# Altium footprint library my Library.PcbLib: 1247 footprints (part 26 of 78)
Each footprint in its own frame and in the unit in brackets; x right, y up, seen from the top. Pads: shape width x height; smd on the part's side, far side on the other; paste and mask are expansions set on the pad; w line width, h text height; cw(c..) or ccw(c..) is an arc to the next point about the centre after c.
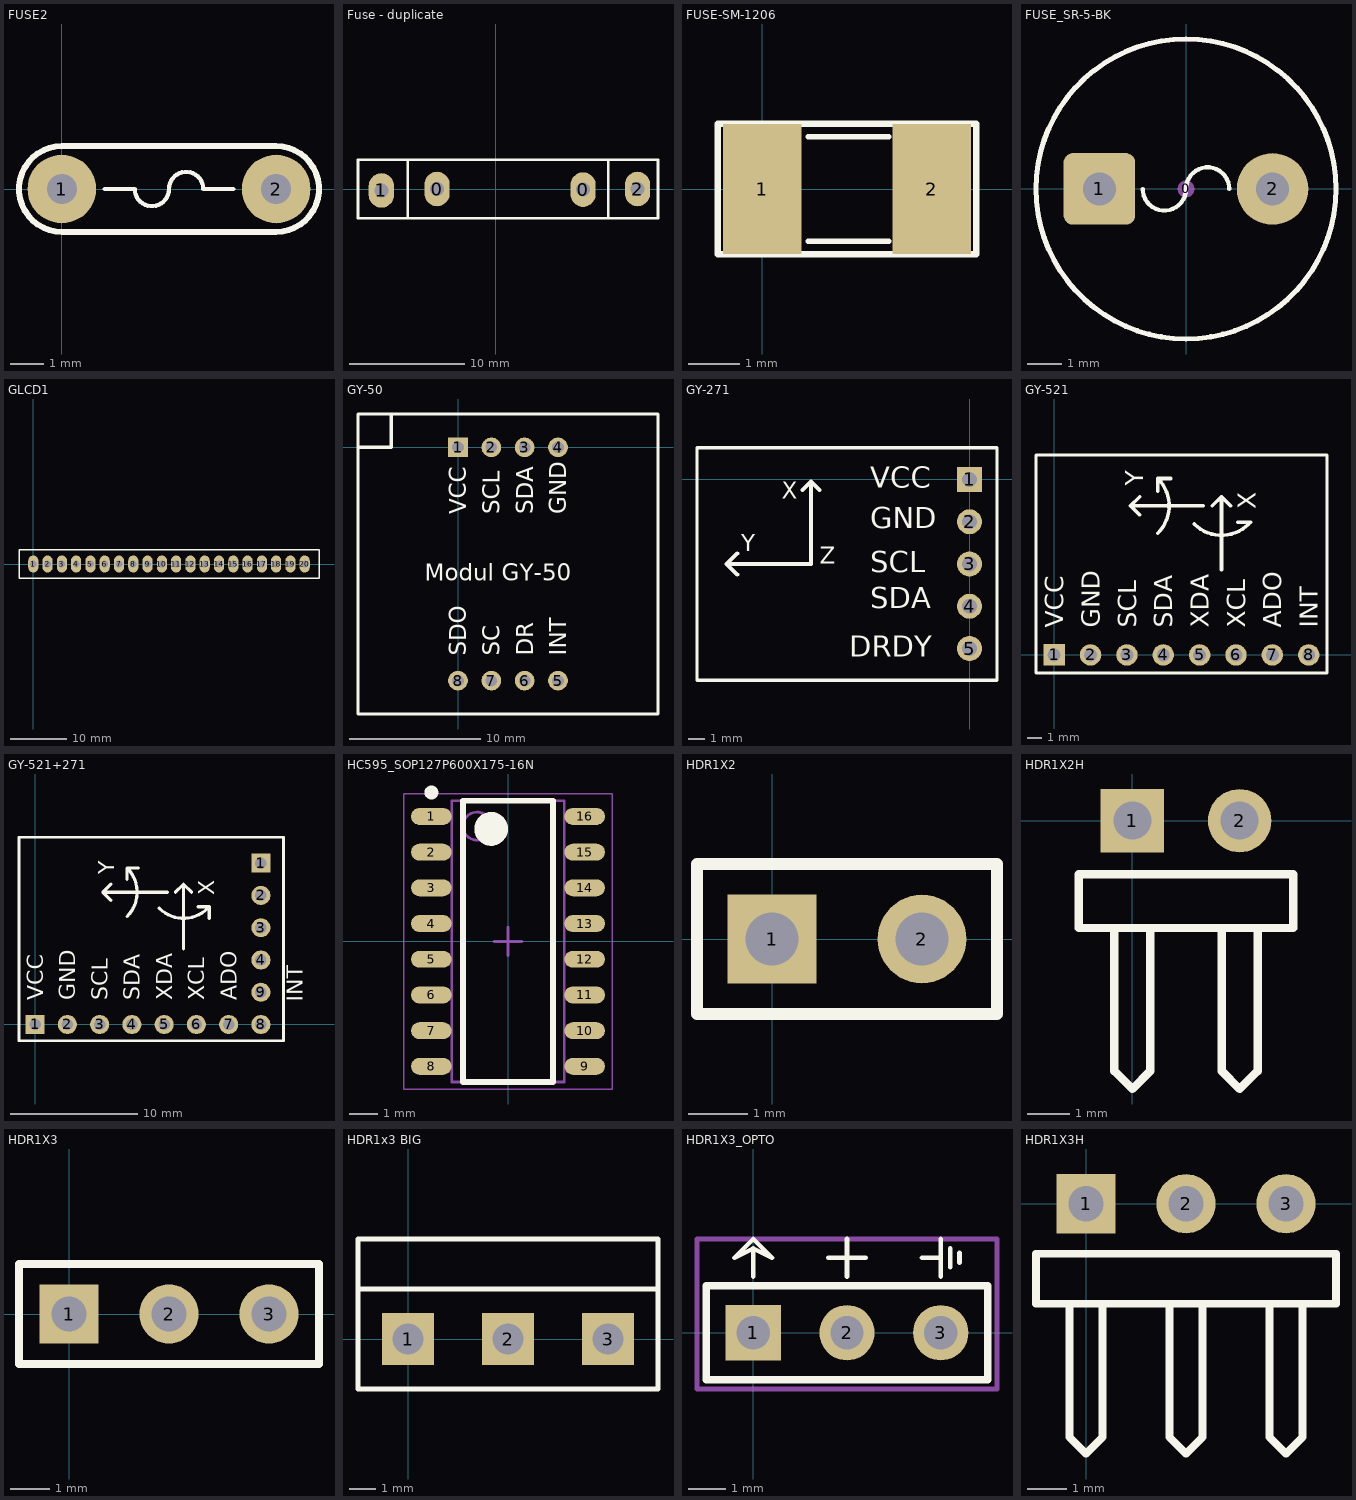
[diagram p25: the footprints below, top view; thin cyan lines are the x and y axes]

## FUSE2 [mil] "Fuse"
pads (2):
  round 80 hole 35: 1(0,0) 2(250,0)
Top Overlay:
  lines w5: 50,0 85,0 ccw(c105,0) 125,0 cw(c145,0) 165,0 200,0
  lines w7: 0,-50 cw(c0,0) 0,50 250,50 cw(c250,0) 250,-50 0,-50

## Fuse - duplicate [mm]
pads (4):
  oval 2.2x3 hole 1.2: 0(-5.08,0) 0(7.595,-0.051) 1(-9.906,-0.127) 2(12.319,0)
Top Overlay:
  lines w0.254: -7.62,-2.54 -7.62,2.54 ; 9.779,-2.54 9.779,2.54 ; -11.938,-2.54 14.097,-2.54 14.097,2.54 -11.938,2.54 -11.938,-2.54

## FUSE-SM-1206 [mil]
pads (2):
  rect 60x100 smd: 1(0,0) 2(130,0)
Top Overlay:
  lines w4: 35,-40 97,-40 ; 35,40 97,40
  lines w5: -34,-50 164,-50 164,50 -34,50 -34,-50
3D body "User Library-Fuse1210.STEP": height 26.57, standoff 0, extent 6.72,-50.68 133.29,50.69

## FUSE_SR-5-BK [mm]
height 9.3
pads (3):
  round 0.5 on Mech15: 0(0,0)
  rrect25% 2.1x2.1 hole 0.965: 1(-2.54,0)
  round 2.1 hole 0.965: 2(2.54,0)
Top Overlay:
  circle w0.152: c0,0 r4.4
  lines w0.127: -1.27,0 ccw(c-0.635,0) 0,0 cw(c0.635,0) 1.27,0
Mechanical 13:
  circle w0.127: c0,-0.003 r4.4
3D body "Fuse_SR-5-BK.STEP": height 8.29, standoff -2.55, extent -4.35,-4.321 4.35,4.315

## GLCD1 [mm]
pads (20):
  oval 1.8x3 hole 1.2: 1(0,0) 2(2.54,0) 3(5.08,0) 4(7.62,0) 5(10.16,0) 6(12.7,0) 7(15.24,0) 8(17.78,0) 9(20.32,0) 10(22.86,0) 11(25.4,0) 12(27.94,0) 13(30.48,0) 14(33.02,0) 15(35.56,0) 16(38.1,0) 17(40.64,0) 18(43.18,0) 19(45.72,0) 20(48.26,0)
Top Overlay:
  lines w0.254: -2.54,-2.54 50.8,-2.54 50.8,2.54 -2.54,2.54 -2.54,-2.54

## GY-50 [mm] "Connector; Header; 8 Position"
height 1.14
pads (8):
  rect 1.5x1.5 hole 0.9: 1(0,0)
  round 1.5 hole 0.9: 2(2.54,0) 3(5.08,0) 4(7.62,0) 5(7.62,-17.78) 6(5.08,-17.78) 7(2.54,-17.78) 8(0,-17.78)
Top Overlay:
  lines w0.2: -7.62,-20.32 -7.62,2.54 15.24,2.54 15.24,-20.32 -7.62,-20.32
  lines w0.254: -7.62,0 -5.08,0 -5.08,2.54
  text "Modul GY-50" at -2.54,-10.16 h1.27
  text "VCC" at 0.635,-5.08 h1.27
  text "SCL" at 3.175,-5.08 h1.27
  text "SDA" at 5.715,-5.08 h1.27
  text "GND" at 8.255,-5.08 h1.27
  text "INT" at 8.255,-15.875 h1.27
  text "DR" at 5.715,-15.875 h1.27
  text "SC" at 3.175,-15.875 h1.27
  text "SDO" at 0.635,-15.875 h1.27

## GY-271 [mm] "Connector; Header; 5 Position"
height 1.14
pads (5):
  rect 1.5x1.5 hole 0.9: 1(0,0)
  round 1.5 hole 0.9: 2(0,-2.54) 3(0,-5.08) 4(0,-7.62) 5(0,-10.16)
Top Overlay:
  lines w0.2: -16.383,-12.065 1.651,-12.065 1.651,1.905 -16.383,1.905 -16.383,-12.065
  lines w0.254: -13.97,-5.715 -14.605,-5.08 ; -13.97,-4.445 -14.605,-5.08 ; -10.033,-0.635 -9.525,-0.127 ; -9.017,-0.635 -9.525,-0.127 ; -14.605,-5.08 -9.525,-5.08 -9.525,-0.127
  text "SDA" at -5.969,-7.747 h1.27
  text "SCL" at -5.969,-5.588 h1.27
  text "GND" at -5.969,-2.921 h1.27
  text "VCC" at -5.969,-0.508 h1.27
  text "DRDY" at -7.239,-10.668 h1.27
  text "X" at -11.303,-1.143 h1.02
  text "Y" at -13.716,-4.318 h1.02
  text "Z" at -9.017,-5.08 h1.02
3D body "female_header_a-bl254-eg-g05d.stp": height 8.52, standoff -3.18, extent -1.257,-11.568 1.243,1.382

## GY-521 [mm] "Connector; Header; 8 Position"
height 1.14
pads (8):
  rect 1.5x1.5 hole 0.9: 1(0,0)
  round 1.5 hole 0.9: 2(2.54,0) 3(5.08,0) 4(7.62,0) 5(10.16,0) 6(12.7,0) 7(15.24,0) 8(17.78,0)
Top Overlay:
  lines w0.2: -1.27,-1.27 -1.27,13.97 19.05,13.97 19.05,-1.27 -1.27,-1.27
  lines w0.254: 5.969,9.779 5.334,10.414 ; 5.969,11.049 5.334,10.414 ; 7.239,8.509 ccw(c5.334,10.414) 7.239,12.319 ; 7.239,11.421 7.239,12.319 ; 8.137,12.319 7.239,12.319 ; 9.779,9.144 ccw(c11.684,11.049) 13.589,9.144 ; 10.414,10.414 5.334,10.414 ; 11.049,10.414 11.684,11.049 ; 11.684,5.969 11.684,11.049 ; 12.319,10.414 11.684,11.049 ; 12.818,9.271 13.716,9.271
  text "Y" at 6.223,11.811 h1.27
  text "X" at 14.097,10.16 h1.27
  text "INT" at 18.415,1.905 h1.27
  text "ADO" at 15.875,1.905 h1.27
  text "XCL" at 13.335,1.905 h1.27
  text "XDA" at 10.795,1.905 h1.27
  text "SDA" at 8.255,1.905 h1.27
  text "SCL" at 5.715,1.905 h1.27
  text "GND" at 3.175,1.905 h1.27
  text "VCC" at 0.635,1.905 h1.27
3D body "female_header_a-bl254-eg-g08d.stp": height 7.92, standoff -3.78, extent -1.395,-1.257 19.175,1.243
3D body "User Library-GY-521.STEP": height 11.93, standoff 0.11, extent -1.27,-1.257 19.05,13.988

## GY-521+271 [mm] "Connector; Header; 8 Position"
height 1.14
pads (13):
  rect 1.5x1.5 hole 0.9: 1(0,0) 1(17.78,12.7)
  round 1.5 hole 0.9: 2(2.54,0) 2(17.78,10.16) 3(5.08,0) 3(17.78,7.62) 4(7.62,0) 4(17.78,5.08) 5(10.16,0) 6(12.7,0) 7(15.24,0) 8(17.78,0) 9(17.78,2.54)
Top Overlay:
  lines w0.2: -1.27,-1.27 -1.27,14.732 19.558,14.732 19.558,-1.27 -1.27,-1.27
  lines w0.254: 5.969,9.779 5.334,10.414 ; 5.969,11.049 5.334,10.414 ; 7.239,8.509 ccw(c5.334,10.414) 7.239,12.319 ; 7.239,11.421 7.239,12.319 ; 8.137,12.319 7.239,12.319 ; 9.779,9.144 ccw(c11.684,11.049) 13.589,9.144 ; 10.414,10.414 5.334,10.414 ; 11.049,10.414 11.684,11.049 ; 11.684,5.969 11.684,11.049 ; 12.319,10.414 11.684,11.049 ; 12.818,9.271 13.716,9.271 13.716,8.373
  text "Y" at 6.223,11.811 h1.27
  text "X" at 14.097,10.16 h1.27
  text "INT" at 21.082,1.778 h1.27
  text "ADO" at 15.875,1.905 h1.27
  text "XCL" at 13.335,1.905 h1.27
  text "XDA" at 10.795,1.905 h1.27
  text "SDA" at 8.255,1.905 h1.27
  text "SCL" at 5.715,1.905 h1.27
  text "GND" at 3.175,1.905 h1.27
  text "VCC" at 0.635,1.905 h1.27
Bottom Overlay:
  lines w0.2: 1.397,1.27 1.397,14.605 19.431,14.605 19.431,1.27 1.397,1.27
  lines w0.254: 3.81,6.985 3.175,7.62 ; 3.81,8.255 3.175,7.62 ; 7.747,12.065 8.255,12.573 ; 8.763,12.065 8.255,12.573 ; 3.175,7.62 8.255,7.62 8.255,12.573
  text "Z" at 8.763,7.62 h1.02
  text "X" at 6.477,11.557 h1.02
  text "Y" at 4.064,8.382 h1.02
  text "DRDY" at 10.541,2.032 h1.27
  text "VCC" at 11.811,12.192 h1.27
  text "GND" at 11.811,9.779 h1.27
  text "SCL" at 11.811,7.112 h1.27
  text "SDA" at 11.811,4.953 h1.27
3D body "female_header_a-bl254-eg-g08d.stp": height 7.92, standoff -3.78, extent -1.395,-1.257 19.175,1.243
3D body "User Library-GY-521.STEP": height 11.93, standoff 0.11, extent -1.27,-1.257 19.05,13.988
3D body "female_header_a-bl254-eg-g05d.stp": height 8.52, standoff -3.18, extent 16.523,1.132 19.023,14.082

## HC595_SOP127P600X175-16N [mm] "SOP, 16-Leads, Body 9.90x3.90mm, Pitch 1.27mm, IPC Medium Density"
height 1.75
pads (16):
  oval 1.45x0.6 smd: 1(-2.725,4.445) 2(-2.725,3.175) 3(-2.725,1.905) 4(-2.725,0.635) 5(-2.725,-0.635) 6(-2.725,-1.905) 7(-2.725,-3.175) 8(-2.725,-4.445) 9(2.725,-4.445) 10(2.725,-3.175) 11(2.725,-1.905) 12(2.725,-0.635) 13(2.725,0.635) 14(2.725,1.905) 15(2.725,3.175) 16(2.725,4.445)
Top Overlay:
  circle w0.6: c-0.6,4 r0.3
  circle w0.25: c-2.725,5.295 r0.125
  lines w0.2: -1.6,-5 1.6,-5 1.6,5 -1.6,5 -1.6,-5
Mechanical 13:
  circle w0.1: c-1.1,4.1 r0.5
  lines w0.1: -2,-5 2,-5 2,5 -2,5 -2,-5
Mechanical 15:
  lines w0.05: -3.7,-5.25 3.7,-5.25 3.7,5.25 -3.7,5.25 -3.7,-5.25
  lines w0.1: -0.5,0 0.5,0 ; 0,-0.5 0,0.5
3D body "SOP127P600X175-16N.step": height 1.75, standoff 0, extent -3,-5 3,5

## HDR1X2 [mm] "Connector; Header; 2 Position"
height 1.14
pads (2):
  rect 1.5x1.5 hole 0.9: 1(0,0)
  round 1.5 hole 0.9: 2(2.54,0)
Top Overlay:
  lines w0.2: -1.27,-1.27 -1.27,1.27 3.81,1.27 3.81,-1.27 -1.27,-1.27
3D body "female_header_a-bl254-eg-g02d.stp": height 7.92, standoff -3.78, extent -1.395,-1.263 3.935,1.237

## HDR1X2H [mm] "Connector; Header; 2 Position; Right Angle"
pads (2):
  rect 1.5x1.5 hole 0.9: 1(0,0)
  round 1.5 hole 0.9: 2(2.54,0)
Top Overlay:
  lines w0.2: -0.423,-2.54 -0.423,-5.927 0,-6.35 0.423,-5.927 0.423,-2.54 ; 2.117,-2.54 2.117,-5.927 2.54,-6.35 2.963,-5.927 2.963,-2.54 ; -1.27,-2.54 3.81,-2.54 3.81,-1.27 -1.27,-1.27 -1.27,-2.54
3D body "User Library-0_1inch 2 pin strip right angle.step": height 4.33, standoff -3, extent -1.27,-7 3.81,1.27

## HDR1X3 [mm] "Connector; Header; 3 Position"
height 1.14
pads (3):
  rect 1.5x1.5 hole 0.9: 1(0,0)
  round 1.5 hole 0.9: 2(2.54,0) 3(5.08,0)
Top Overlay:
  lines w0.2: -1.27,-1.27 -1.27,1.27 6.35,1.27 6.35,-1.27 -1.27,-1.27
3D body "female_header_a-bl254-eg-g03d.stp": height 5.12, standoff -6.58, extent -1.395,-1.25 6.475,1.25

## HDR1x3 BIG [mm] "3 chan cam 7805, BJT to, FET to..."
pads (3):
  rect 2x2 / inner round 1.575 / far side rect 2x2 hole 1.2: 1(0,0) 2(3.81,0) 3(7.62,0)
Top Overlay:
  lines w0.2: -1.905,1.905 9.525,1.905 ; -1.905,-1.905 9.525,-1.905 9.525,3.81 -1.905,3.81 -1.905,2.54 -1.905,-1.905

## HDR1X3_OPTO [mm] "Connector; Header; 3 Position"
pads (3):
  rect 1.5x1.5 hole 0.9: 1(0,0)
  round 1.5 hole 0.9: 2(2.54,0) 3(5.08,0)
Top Overlay:
  lines w0.127: 0,1.524 0,2.286 ; 2.032,2.032 3.048,2.032 ; 2.54,1.524 2.54,2.54 ; 4.572,2.032 5.08,2.032 5.08,2.54 5.08,1.524 ; 5.334,1.778 5.334,2.286 ; 5.588,1.905 5.588,2.159 ; 0,2.286 -0.508,2.032 0,2.54 0.508,2.032 0,2.286
  lines w0.2: -1.27,-1.27 -1.27,1.27 6.35,1.27 6.35,-1.27 -1.27,-1.27
Mechanical 15:
  lines w0.127: -1.524,-1.524 -1.524,2.54 6.604,2.54 6.604,-1.524 -1.524,-1.524

## HDR1X3H [mm] "Connector; Header; 3 Position; Right Angle"
pads (3):
  rect 1.5x1.5 hole 0.9: 1(0,0)
  round 1.5 hole 0.9: 2(2.54,0) 3(5.08,0)
Top Overlay:
  lines w0.2: -0.423,-2.54 -0.423,-5.927 0,-6.35 0.423,-5.927 0.423,-2.54 ; 2.117,-2.54 2.117,-5.927 2.54,-6.35 2.963,-5.927 2.963,-2.54 ; 4.657,-2.54 4.657,-5.927 5.08,-6.35 5.503,-5.927 5.503,-2.54 ; -1.27,-2.54 -1.27,-1.27 6.35,-1.27 6.35,-2.54 -1.27,-2.54
3D body "User Library-0_1inch 3pin strip right angle.step": height 4.33, standoff -3, extent -1.27,-7 6.35,1.27